# Altium footprint library STM32F1.PcbLib: 1 footprints
Each footprint in its own frame and in the unit in brackets; x right, y up, seen from the top. Pads: shape width x height; smd on the part's side, far side on the other; paste and mask are expansions set on the pad; w line width, h text height; cw(c..) or ccw(c..) is an arc to the next point about the centre after c.
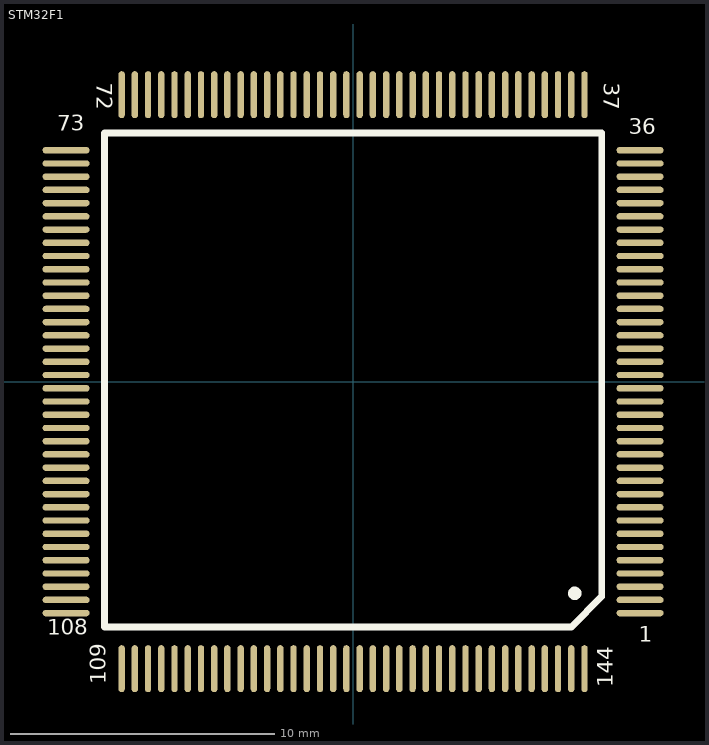
[diagram p0: the footprint, top view; thin cyan lines are the x and y axes]

## STM32F1 [mm] "ARM单片机STM32F103ZET6"
pads (144):
  oval 1.778x0.241 smd: 1(10.85,-8.75) 2(10.85,-8.25) 3(10.85,-7.75) 4(10.85,-7.25) 5(10.85,-6.75) 6(10.85,-6.25) 7(10.85,-5.75) 8(10.85,-5.25) 9(10.85,-4.75) 10(10.85,-4.25) 11(10.85,-3.75) 12(10.85,-3.25) 13(10.85,-2.75) 14(10.85,-2.25) 15(10.85,-1.75) 16(10.85,-1.25) 17(10.85,-0.75) 18(10.85,-0.25) 19(10.85,0.25) 20(10.85,0.75) 21(10.85,1.25) 22(10.85,1.75) 23(10.85,2.25) 24(10.85,2.75) 25(10.85,3.25) 26(10.85,3.75) 27(10.85,4.25) 28(10.85,4.75) 29(10.85,5.25) 30(10.85,5.75) 31(10.85,6.25) 32(10.85,6.75) 33(10.85,7.25) 34(10.85,7.75) 35(10.85,8.25) 36(10.85,8.75) 73(-10.85,8.75) 74(-10.85,8.25) 75(-10.85,7.75) 76(-10.85,7.25) 77(-10.85,6.75) 78(-10.85,6.25) 79(-10.85,5.75) 80(-10.85,5.25) 81(-10.85,4.75) 82(-10.85,4.25) 83(-10.85,3.75) 84(-10.85,3.25) 85(-10.85,2.75) 86(-10.85,2.25) 87(-10.85,1.75) 88(-10.85,1.25) 89(-10.85,0.75) 90(-10.85,0.25) 91(-10.85,-0.25) 92(-10.85,-0.75) 93(-10.85,-1.25) 94(-10.85,-1.75) 95(-10.85,-2.25) 96(-10.85,-2.75) 97(-10.85,-3.25) 98(-10.85,-3.75) 99(-10.85,-4.25) 100(-10.85,-4.75) 101(-10.85,-5.25) 102(-10.85,-5.75) 103(-10.85,-6.25) 104(-10.85,-6.75) 105(-10.85,-7.25) 106(-10.85,-7.75) 107(-10.85,-8.25) 108(-10.85,-8.75)
  oval 0.241x1.778 smd: 37(8.75,10.85) 38(8.25,10.85) 39(7.75,10.85) 40(7.25,10.85) 41(6.75,10.85) 42(6.25,10.85) 43(5.75,10.85) 44(5.25,10.85) 45(4.75,10.85) 46(4.25,10.85) 47(3.75,10.85) 48(3.25,10.85) 49(2.75,10.85) 50(2.25,10.85) 51(1.75,10.85) 52(1.25,10.85) 53(0.75,10.85) 54(0.25,10.85) 55(-0.25,10.85) 56(-0.75,10.85) 57(-1.25,10.85) 58(-1.75,10.85) 59(-2.25,10.85) 60(-2.75,10.85) 61(-3.25,10.85) 62(-3.75,10.85) 63(-4.25,10.85) 64(-4.75,10.85) 65(-5.25,10.85) 66(-5.75,10.85) 67(-6.25,10.85) 68(-6.75,10.85) 69(-7.25,10.85) 70(-7.75,10.85) 71(-8.25,10.85) 72(-8.75,10.85) 109(-8.75,-10.85) 110(-8.25,-10.85) 111(-7.75,-10.85) 112(-7.25,-10.85) 113(-6.75,-10.85) 114(-6.25,-10.85) 115(-5.75,-10.85) 116(-5.25,-10.85) 117(-4.75,-10.85) 118(-4.25,-10.85) 119(-3.75,-10.85) 120(-3.25,-10.85) 121(-2.75,-10.85) 122(-2.25,-10.85) 123(-1.75,-10.85) 124(-1.25,-10.85) 125(-0.75,-10.85) 126(-0.25,-10.85) 127(0.25,-10.85) 128(0.75,-10.85) 129(1.25,-10.85) 130(1.75,-10.85) 131(2.25,-10.85) 132(2.75,-10.85) 133(3.25,-10.85) 134(3.75,-10.85) 135(4.25,-10.85) 136(4.75,-10.85) 137(5.25,-10.85) 138(5.75,-10.85) 139(6.25,-10.85) 140(6.75,-10.85) 141(7.25,-10.85) 142(7.75,-10.85) 143(8.25,-10.85) 144(8.75,-10.85)
Top Overlay:
  circle w0.254: c8.382,-8.001 r0.127
  lines w0.254: -9.398,-9.271 8.255,-9.271 9.398,-8.128 9.398,9.398 -9.398,9.398 -9.398,-9.271
  text "144" at 10.033,-11.557 h1.02
  text "109" at -9.144,-11.43 h1.02
  text "108" at -11.557,-9.779 h1.02
  text "73" at -11.176,9.271 h1.02
  text "72" at -9.906,11.303 h1.02
  text "37" at 9.271,11.303 h1.02
  text "36" at 10.414,9.144 h1.02
  text "1" at 10.795,-10.033 h1.02